# Altium schematic symbol library TI Power Management Shunt Voltage Reference.SchLib: 1526 symbols (part 6 of 18) (continued)
## LM4041CIDCKTG4
designator U?
Adjustable Precision Micropower Shunt Voltage Reference, 0.5% accuracy, 15 ppm / degC, 12 mA, -40 to 85 degC, 5-pin SC70 (DCK), Green (RoHS & no Sb/Br); Manufacturer: Texas Instruments; PartNumber: LM4041CIDCKTG4; Initial Accuracy @ 25/deg C(%): 0.5; Iout/Iz(Max)(mA): 12; Min Iz for Regulation(uA): 60; Rating: Catalog; Temp Coeff(Max)(ppm/ degree C): 100; Temp Coeff(Typ)(ppm/ degree C): 15; VO Adj(Min)(V): 1.225; DatasheetVersion: SLCS146E; PackageReference: DCK5; PackageDescription: 5-Pin Plastic Small-Outline Package, 2 x 1.3 mm Body, 0.65 mm Pitch, 2.1 mm Lead Span; Supplier 1: Digi-Key; Supplier Part Number 1: LM4041CIDCKTG4-ND; Supplier 2: Newark; Supplier Part Number 2: 41M3459; Supplier 3: Mouser; Supplier Part Number 3: 595-LM4041CIDCKTG4; Eco-Plan: Green (RoHS & no Sb/Br); SubFamily: Shunt Voltage Reference; VO Adj(Max)(V): 15; Mounting Technology: Surface Mount; Code_JEDEC: MO-203; ComponentLink1Description: Manufacturer URL; ComponentLink1URL: http://www.ti.com/; ComponentLink2Description: Datasheet; ComponentLink2URL: http://www.ti.com/general/docs/lit/getliterature.tsp?genericPartNumber=LM4041C&fileType=pdf; ComponentLink3Description: Package Specification; ComponentLink3URL: http://www.ti.com/litv/pdf/mpds025f
footprint TI-DCK5_N (SOT353, 5-Leads, Body 2x1.3mm, Pitch 0.65mm, Lead Span 2.1mm, IPC Medium Density)
part A pins: 2 ANODE, 3 CATHODE, 5 FB (in)
part B pins: 1 NC "No internal connection", 4 NC "No internal connection"

## LM4041CILP
designator U?
Adjustable Precision Micropower Shunt Voltage Reference, 0.5% accuracy, 15 ppm / degC, 12 mA, -40 to 85 degC, 3-pin TO-92 (LP), Pb-Free (RoHS); Manufacturer: Texas Instruments; PartNumber: LM4041CILP; Initial Accuracy @ 25/deg C(%): 0.5; Iout/Iz(Max)(mA): 12; Min Iz for Regulation(uA): 60; Rating: Catalog; Temp Coeff(Max)(ppm/ degree C): 100; Temp Coeff(Typ)(ppm/ degree C): 15; VO Adj(Max)(V): 10; VO Adj(Min)(V): 1.225; DatasheetVersion: SLCS146E; PackageVersion: 4040001-2/C; PackageReference: LP3; PackageDescription: Plastic Cylindrical Package, Formed Lead Option (TO-92); Supplier 1: Digi-Key; Supplier Part Number 1: LM4041CILP-ND; Supplier 2: Newark; Supplier Part Number 2: 50M8856; Supplier 3: Mouser; Supplier Part Number 3: 595-LM4041CILP; Eco-Plan: Pb-Free (RoHS); SubFamily: Shunt Voltage Reference; Mounting Technology: Through Hole; Code_JEDEC: TO-226; ComponentLink1Description: Manufacturer URL; ComponentLink1URL: http://www.ti.com/; ComponentLink2Description: Datasheet; ComponentLink2URL: http://www.ti.com/general/docs/lit/getliterature.tsp?genericPartNumber=LM4041C&fileType=pdf; ComponentLink3Description: Package Specification; ComponentLink3URL: http://www.ti.com/litv/pdf/msot002a
footprint TI-LP3 (TO, Flat Index; 3 In-Line, Formed Axial Leads; Body Dia. 4.8mm; Leads 0.56 x 0.41 mm (max))
pins: 1 FB (in), 2 CATHODE, 3 ANODE

## LM4041CILPE3
designator U?
Adjustable Precision Micropower Shunt Voltage Reference, 0.5% accuracy, 15 ppm / degC, 12 mA, -40 to 85 degC, 3-pin TO-92 (LP), Pb-Free (RoHS); Manufacturer: Texas Instruments; PartNumber: LM4041CILPE3; Initial Accuracy @ 25/deg C(%): 0.5; Iout/Iz(Max)(mA): 12; Min Iz for Regulation(uA): 60; Rating: Catalog; Temp Coeff(Max)(ppm/ degree C): 100; Temp Coeff(Typ)(ppm/ degree C): 15; VO Adj(Min)(V): 1.225; DatasheetVersion: SLCS146E; PackageVersion: 4040001-2/C; PackageReference: LP3; PackageDescription: Plastic Cylindrical Package, Formed Lead Option (TO-92); Supplier 1: Digi-Key; Supplier Part Number 1: LM4041CILPE3-ND; Supplier 2: Newark; Supplier Part Number 2: 65M1446; Supplier 3: Mouser; Supplier Part Number 3: 595-LM4041CILPE3; Eco-Plan: Pb-Free (RoHS); SubFamily: Shunt Voltage Reference; VO Adj(Max)(V): 15; Mounting Technology: Through Hole; Code_JEDEC: TO-226; ComponentLink1Description: Manufacturer URL; ComponentLink1URL: http://www.ti.com/; ComponentLink2Description: Datasheet; ComponentLink2URL: http://www.ti.com/general/docs/lit/getliterature.tsp?genericPartNumber=LM4041C&fileType=pdf; ComponentLink3Description: Package Specification; ComponentLink3URL: http://www.ti.com/litv/pdf/msot002a
footprint TI-LP3 (TO, Flat Index; 3 In-Line, Formed Axial Leads; Body Dia. 4.8mm; Leads 0.56 x 0.41 mm (max))
pins: 1 FB (in), 2 CATHODE, 3 ANODE

## LM4041CILPR
designator U?
Adjustable Precision Micropower Shunt Voltage Reference, 0.5% accuracy, 15 ppm / degC, 12 mA, -40 to 85 degC, 3-pin TO-92 (LP), Pb-Free (RoHS); Manufacturer: Texas Instruments; PartNumber: LM4041CILPR; Initial Accuracy @ 25/deg C(%): 0.5; Iout/Iz(Max)(mA): 12; Min Iz for Regulation(uA): 60; Rating: Catalog; Temp Coeff(Max)(ppm/ degree C): 100; Temp Coeff(Typ)(ppm/ degree C): 15; VO Adj(Max)(V): 10; VO Adj(Min)(V): 1.225; DatasheetVersion: SLCS146E; PackageVersion: 4040001-2/C; PackageReference: LP3; PackageDescription: Plastic Cylindrical Package, Formed Lead Option (TO-92); Supplier 1: Digi-Key; Supplier Part Number 1: 296-22173-3-ND; Supplier 2: Digi-Key; Supplier Part Number 2: 296-22173-1-ND; Supplier 3: Newark; Supplier Part Number 3: 50M8857; Supplier 4: Mouser; Supplier Part Number 4: 595-LM4041CILPR; Eco-Plan: Pb-Free (RoHS); SubFamily: Shunt Voltage Reference; Mounting Technology: Through Hole; Code_JEDEC: TO-226; ComponentLink1Description: Manufacturer URL; ComponentLink1URL: http://www.ti.com/; ComponentLink2Description: Datasheet; ComponentLink2URL: http://www.ti.com/general/docs/lit/getliterature.tsp?genericPartNumber=LM4041C&fileType=pdf; ComponentLink3Description: Package Specification; ComponentLink3URL: http://www.ti.com/litv/pdf/msot002a
footprint TI-LP3 (TO, Flat Index; 3 In-Line, Formed Axial Leads; Body Dia. 4.8mm; Leads 0.56 x 0.41 mm (max))
pins: 1 FB (in), 2 CATHODE, 3 ANODE

## LM4041CILPRE3
designator U?
Adjustable Precision Micropower Shunt Voltage Reference, 0.5% accuracy, 15 ppm / degC, 12 mA, -40 to 85 degC, 3-pin TO-92 (LP), Pb-Free (RoHS); Manufacturer: Texas Instruments; PartNumber: LM4041CILPRE3; Initial Accuracy @ 25/deg C(%): 0.5; Iout/Iz(Max)(mA): 12; Min Iz for Regulation(uA): 60; Rating: Catalog; Temp Coeff(Max)(ppm/ degree C): 100; Temp Coeff(Typ)(ppm/ degree C): 15; VO Adj(Min)(V): 1.225; DatasheetVersion: SLCS146E; PackageVersion: 4040001-2/C; PackageReference: LP3; PackageDescription: Plastic Cylindrical Package, Formed Lead Option (TO-92); Supplier 1: Digi-Key; Supplier Part Number 1: LM4041CILPRE3-ND; Supplier 2: Newark; Supplier Part Number 2: 65M1447; Supplier 3: Mouser; Supplier Part Number 3: 595-LM4041CILPRE3; Eco-Plan: Pb-Free (RoHS); SubFamily: Shunt Voltage Reference; VO Adj(Max)(V): 15; Mounting Technology: Through Hole; Code_JEDEC: TO-226; ComponentLink1Description: Manufacturer URL; ComponentLink1URL: http://www.ti.com/; ComponentLink2Description: Datasheet; ComponentLink2URL: http://www.ti.com/general/docs/lit/getliterature.tsp?genericPartNumber=LM4041C&fileType=pdf; ComponentLink3Description: Package Specification; ComponentLink3URL: http://www.ti.com/litv/pdf/msot002a
footprint TI-LP3 (TO, Flat Index; 3 In-Line, Formed Axial Leads; Body Dia. 4.8mm; Leads 0.56 x 0.41 mm (max))
pins: 1 FB (in), 2 CATHODE, 3 ANODE

## LM4041CQDBZR
designator U?
Adjustable Precision Micropower Shunt Voltage Reference, 0.5% accuracy, 15 ppm / degC, 12 mA, -40 to 125 degC, 3-pin SOT-23 (DBZ), Green (RoHS & no Sb/Br); Manufacturer: Texas Instruments; PartNumber: LM4041CQDBZR; Initial Accuracy @ 25/deg C(%): 0.5; Iout/Iz(Max)(mA): 12; Min Iz for Regulation(uA): 60; Rating: Catalog; Temp Coeff(Max)(ppm/ degree C): 100; Temp Coeff(Typ)(ppm/ degree C): 15; VO Adj(Max)(V): 10; VO Adj(Min)(V): 1.225; DatasheetVersion: SLCS146E; PackageVersion: 4203227/B; PackageReference: DBZ3; PackageDescription: 3-Pin Plastic Small Outline, Body 2.92 x 1.3 mm, Pitch 0.95 mm; Supplier 1: Digi-Key; Supplier Part Number 1: 296-17945-2-ND; Supplier 2: Digi-Key; Supplier Part Number 2: 296-17945-1-ND; Supplier 3: Digi-Key; Supplier Part Number 3: 296-17945-6-ND; Supplier 4: Mouser; Supplier Part Number 4: 595-LM4041CQDBZR; Eco-Plan: Green (RoHS & no Sb/Br); SubFamily: Shunt Voltage Reference; Mounting Technology: Surface Mount; Code_JEDEC: TO-236; ComponentLink1Description: Manufacturer URL; ComponentLink1URL: http://www.ti.com/; ComponentLink2Description: Datasheet; ComponentLink2URL: http://www.ti.com/general/docs/lit/getliterature.tsp?genericPartNumber=LM4041C&fileType=pdf; ComponentLink3Description: Package Specification; ComponentLink3URL: http://www.ti.com/litv/pdf/mpds108a
footprint TI-DBZ3_N (SOT23, 3-Leads, Body 2.92x1.3 mm, Pitch 0.95 mm, IPC Medium Density)
pins: 1 FB (in), 2 CATHODE, 3 ANODE

## LM4041CQDBZRG4
designator U?
Adjustable Precision Micropower Shunt Voltage Reference, 0.5% accuracy, 15 ppm / degC, 12 mA, -40 to 125 degC, 3-pin SOT-23 (DBZ), Green (RoHS & no Sb/Br); Manufacturer: Texas Instruments; PartNumber: LM4041CQDBZRG4; Initial Accuracy @ 25/deg C(%): 0.5; Iout/Iz(Max)(mA): 12; Min Iz for Regulation(uA): 60; Rating: Catalog; Temp Coeff(Max)(ppm/ degree C): 100; Temp Coeff(Typ)(ppm/ degree C): 15; VO Adj(Min)(V): 1.225; DatasheetVersion: SLCS146E; PackageVersion: 4203227/B; PackageReference: DBZ3; PackageDescription: 3-Pin Plastic Small Outline, Body 2.92 x 1.3 mm, Pitch 0.95 mm; Supplier 1: Digi-Key; Supplier Part Number 1: LM4041CQDBZRG4-ND; Supplier 2: Mouser; Supplier Part Number 2: 595-LM4041CQDBZRG4; Eco-Plan: Green (RoHS & no Sb/Br); SubFamily: Shunt Voltage Reference; VO Adj(Max)(V): 15; Mounting Technology: Surface Mount; Code_JEDEC: TO-236; ComponentLink1Description: Manufacturer URL; ComponentLink1URL: http://www.ti.com/; ComponentLink2Description: Datasheet; ComponentLink2URL: http://www.ti.com/general/docs/lit/getliterature.tsp?genericPartNumber=LM4041C&fileType=pdf; ComponentLink3Description: Package Specification; ComponentLink3URL: http://www.ti.com/litv/pdf/mpds108a
footprint TI-DBZ3_N (SOT23, 3-Leads, Body 2.92x1.3 mm, Pitch 0.95 mm, IPC Medium Density)
pins: 1 FB (in), 2 CATHODE, 3 ANODE

## LM4041CQDBZT
designator U?
Adjustable Precision Micropower Shunt Voltage Reference, 0.5% accuracy, 15 ppm / degC, 12 mA, -40 to 125 degC, 3-pin SOT-23 (DBZ), Green (RoHS & no Sb/Br); Manufacturer: Texas Instruments; PartNumber: LM4041CQDBZT; Initial Accuracy @ 25/deg C(%): 0.5; Iout/Iz(Max)(mA): 12; Min Iz for Regulation(uA): 60; Rating: Catalog; Temp Coeff(Max)(ppm/ degree C): 100; Temp Coeff(Typ)(ppm/ degree C): 15; VO Adj(Min)(V): 1.225; DatasheetVersion: SLCS146E; PackageVersion: 4203227/B; PackageReference: DBZ3; PackageDescription: 3-Pin Plastic Small Outline, Body 2.92 x 1.3 mm, Pitch 0.95 mm; Supplier 1: Digi-Key; Supplier Part Number 1: 296-32131-2-ND; Supplier 2: Digi-Key; Supplier Part Number 2: 296-32131-1-ND; Supplier 3: Digi-Key; Supplier Part Number 3: 296-32131-6-ND; Supplier 4: Newark; Supplier Part Number 4: 31K7144; Supplier 5: Mouser; Supplier Part Number 5: 595-LM4041CQDBZT; Eco-Plan: Green (RoHS & no Sb/Br); SubFamily: Shunt Voltage Reference; VO Adj(Max)(V): 15; Mounting Technology: Surface Mount; Code_JEDEC: TO-236; ComponentLink1Description: Manufacturer URL; ComponentLink1URL: http://www.ti.com/; ComponentLink2Description: Datasheet; ComponentLink2URL: http://www.ti.com/general/docs/lit/getliterature.tsp?genericPartNumber=LM4041C&fileType=pdf; ComponentLink3Description: Package Specification; ComponentLink3URL: http://www.ti.com/litv/pdf/mpds108a
footprint TI-DBZ3_N (SOT23, 3-Leads, Body 2.92x1.3 mm, Pitch 0.95 mm, IPC Medium Density)
pins: 1 FB (in), 2 CATHODE, 3 ANODE

## LM4041CQDBZTG4
designator U?
Adjustable Precision Micropower Shunt Voltage Reference, 0.5% accuracy, 15 ppm / degC, 12 mA, -40 to 125 degC, 3-pin SOT-23 (DBZ), Green (RoHS & no Sb/Br); Manufacturer: Texas Instruments; PartNumber: LM4041CQDBZTG4; Initial Accuracy @ 25/deg C(%): 0.5; Iout/Iz(Max)(mA): 12; Min Iz for Regulation(uA): 60; Rating: Catalog; Temp Coeff(Max)(ppm/ degree C): 100; Temp Coeff(Typ)(ppm/ degree C): 15; VO Adj(Min)(V): 1.225; DatasheetVersion: SLCS146E; PackageVersion: 4203227/B; PackageReference: DBZ3; PackageDescription: 3-Pin Plastic Small Outline, Body 2.92 x 1.3 mm, Pitch 0.95 mm; Supplier 1: Digi-Key; Supplier Part Number 1: LM4041CQDBZTG4-ND; Supplier 2: Farnell; Supplier Part Number 2: 1053792; Supplier 3: Newark; Supplier Part Number 3: 97K3502; Supplier 4: Mouser; Supplier Part Number 4: 595-LM4041CQDBZTG4; Eco-Plan: Green (RoHS & no Sb/Br); SubFamily: Shunt Voltage Reference; VO Adj(Max)(V): 15; Mounting Technology: Surface Mount; Code_JEDEC: TO-236; ComponentLink1Description: Manufacturer URL; ComponentLink1URL: http://www.ti.com/; ComponentLink2Description: Datasheet; ComponentLink2URL: http://www.ti.com/general/docs/lit/getliterature.tsp?genericPartNumber=LM4041C&fileType=pdf; ComponentLink3Description: Package Specification; ComponentLink3URL: http://www.ti.com/litv/pdf/mpds108a
footprint TI-DBZ3_N (SOT23, 3-Leads, Body 2.92x1.3 mm, Pitch 0.95 mm, IPC Medium Density)
pins: 1 FB (in), 2 CATHODE, 3 ANODE

## LM4041D12IDBZR
designator U?
Precision Micropower Shunt Voltage Reference, 1.0% accuracy, 1.225 V, 15 ppm / degC, 12 mA, -40 to 85 degC, 3-pin SOT-23 (DBZ), Green (RoHS & no Sb/Br); Manufacturer: Texas Instruments; PartNumber: LM4041D12IDBZR; Initial Accuracy @ 25/deg C(%): 1; Iout/Iz(Max)(mA): 12; Min Iz for Regulation(uA): 60; Rating: Catalog; Temp Coeff(Max)(ppm/ degree C): 150; Temp Coeff(Typ)(ppm/ degree C): 15; VO(V): 1.225; DatasheetVersion: SLCS146E; PackageVersion: 4203227/B; PackageReference: DBZ3; PackageDescription: 3-Pin Plastic Small Outline, Body 2.92 x 1.3 mm, Pitch 0.95 mm; Supplier 1: Digi-Key; Supplier Part Number 1: 296-20919-2-ND; Supplier 2: Digi-Key; Supplier Part Number 2: 296-20919-1-ND; Supplier 3: Digi-Key; Supplier Part Number 3: 296-20919-6-ND; Supplier 4: Newark; Supplier Part Number 4: 43K3377; Supplier 5: Mouser; Supplier Part Number 5: 595-LM4041D12IDBZR; Eco-Plan: Green (RoHS & no Sb/Br); SubFamily: Shunt Voltage Reference; Mounting Technology: Surface Mount; Code_JEDEC: TO-236; ComponentLink1Description: Manufacturer URL; ComponentLink1URL: http://www.ti.com/; ComponentLink2Description: Datasheet; ComponentLink2URL: http://www.ti.com/general/docs/lit/getliterature.tsp?genericPartNumber=LM4041D12&fileType=pdf; ComponentLink3Description: Package Specification; ComponentLink3URL: http://www.ti.com/litv/pdf/mpds108a
footprint TI-DBZ3_N (SOT23, 3-Leads, Body 2.92x1.3 mm, Pitch 0.95 mm, IPC Medium Density)
pins: 1 CATHODE, 2 ANODE, 3 NC

## LM4041D12IDBZRG4
designator U?
Precision Micropower Shunt Voltage Reference, 1.0% accuracy, 1.225 V, 15 ppm / degC, 12 mA, -40 to 85 degC, 3-pin SOT-23 (DBZ), Green (RoHS & no Sb/Br); Manufacturer: Texas Instruments; PartNumber: LM4041D12IDBZRG4; Initial Accuracy @ 25/deg C(%): 1; Iout/Iz(Max)(mA): 12; Min Iz for Regulation(uA): 60; Rating: Catalog; Temp Coeff(Max)(ppm/ degree C): 150; Temp Coeff(Typ)(ppm/ degree C): 15; VO(V): 1.225; DatasheetVersion: SLCS146E; PackageVersion: 4203227/B; PackageReference: DBZ3; PackageDescription: 3-Pin Plastic Small Outline, Body 2.92 x 1.3 mm, Pitch 0.95 mm; Supplier 1: Digi-Key; Supplier Part Number 1: LM4041D12IDBZRG4-ND; Supplier 2: Mouser; Supplier Part Number 2: 595-LM4041D12IDBZRG4; Eco-Plan: Green (RoHS & no Sb/Br); SubFamily: Shunt Voltage Reference; Mounting Technology: Surface Mount; Code_JEDEC: TO-236; ComponentLink1Description: Manufacturer URL; ComponentLink1URL: http://www.ti.com/; ComponentLink2Description: Datasheet; ComponentLink2URL: http://www.ti.com/general/docs/lit/getliterature.tsp?genericPartNumber=LM4041D12&fileType=pdf; ComponentLink3Description: Package Specification; ComponentLink3URL: http://www.ti.com/litv/pdf/mpds108a
footprint TI-DBZ3_N (SOT23, 3-Leads, Body 2.92x1.3 mm, Pitch 0.95 mm, IPC Medium Density)
pins: 1 CATHODE, 2 ANODE, 3 NC

## LM4041D12IDBZT
designator U?
Precision Micropower Shunt Voltage Reference, 1.0% accuracy, 1.225 V, 15 ppm / degC, 12 mA, -40 to 85 degC, 3-pin SOT-23 (DBZ), Green (RoHS & no Sb/Br); Manufacturer: Texas Instruments; PartNumber: LM4041D12IDBZT; Initial Accuracy @ 25/deg C(%): 1; Iout/Iz(Max)(mA): 12; Min Iz for Regulation(uA): 60; Rating: Catalog; Temp Coeff(Max)(ppm/ degree C): 150; Temp Coeff(Typ)(ppm/ degree C): 15; VO(V): 1.225; DatasheetVersion: SLCS146E; PackageVersion: 4203227/B; PackageReference: DBZ3; PackageDescription: 3-Pin Plastic Small Outline, Body 2.92 x 1.3 mm, Pitch 0.95 mm; Supplier 1: Digi-Key; Supplier Part Number 1: LM4041D12IDBZT-ND; Supplier 2: Newark; Supplier Part Number 2: 43K3378; Supplier 3: Mouser; Supplier Part Number 3: 595-LM4041D12IDBZT; Eco-Plan: Green (RoHS & no Sb/Br); SubFamily: Shunt Voltage Reference; Mounting Technology: Surface Mount; Code_JEDEC: TO-236; ComponentLink1Description: Manufacturer URL; ComponentLink1URL: http://www.ti.com/; ComponentLink2Description: Datasheet; ComponentLink2URL: http://www.ti.com/general/docs/lit/getliterature.tsp?genericPartNumber=LM4041D12&fileType=pdf; ComponentLink3Description: Package Specification; ComponentLink3URL: http://www.ti.com/litv/pdf/mpds108a
footprint TI-DBZ3_N (SOT23, 3-Leads, Body 2.92x1.3 mm, Pitch 0.95 mm, IPC Medium Density)
pins: 1 CATHODE, 2 ANODE, 3 NC

## LM4041D12IDBZTG4
designator U?
Precision Micropower Shunt Voltage Reference, 1.0% accuracy, 1.225 V, 15 ppm / degC, 12 mA, -40 to 85 degC, 3-pin SOT-23 (DBZ), Green (RoHS & no Sb/Br); Manufacturer: Texas Instruments; PartNumber: LM4041D12IDBZTG4; Initial Accuracy @ 25/deg C(%): 1; Iout/Iz(Max)(mA): 12; Min Iz for Regulation(uA): 60; Rating: Catalog; Temp Coeff(Max)(ppm/ degree C): 150; Temp Coeff(Typ)(ppm/ degree C): 15; VO(V): 1.225; DatasheetVersion: SLCS146E; PackageVersion: 4203227/B; PackageReference: DBZ3; PackageDescription: 3-Pin Plastic Small Outline, Body 2.92 x 1.3 mm, Pitch 0.95 mm; Supplier 1: Digi-Key; Supplier Part Number 1: LM4041D12IDBZTG4-ND; Supplier 2: Mouser; Supplier Part Number 2: 595-LM4041D12IDBZTG4; Eco-Plan: Green (RoHS & no Sb/Br); SubFamily: Shunt Voltage Reference; Mounting Technology: Surface Mount; Code_JEDEC: TO-236; ComponentLink1Description: Manufacturer URL; ComponentLink1URL: http://www.ti.com/; ComponentLink2Description: Datasheet; ComponentLink2URL: http://www.ti.com/general/docs/lit/getliterature.tsp?genericPartNumber=LM4041D12&fileType=pdf; ComponentLink3Description: Package Specification; ComponentLink3URL: http://www.ti.com/litv/pdf/mpds108a
footprint TI-DBZ3_N (SOT23, 3-Leads, Body 2.92x1.3 mm, Pitch 0.95 mm, IPC Medium Density)
pins: 1 CATHODE, 2 ANODE, 3 NC

## LM4041D12IDCKR
designator U?
Precision Micropower Shunt Voltage Reference, 1.0% accuracy, 1.225 V, 15 ppm / degC, 12 mA, -40 to 85 degC, 5-pin SC70 (DCK), Green (RoHS & no Sb/Br); Manufacturer: Texas Instruments; PartNumber: LM4041D12IDCKR; Initial Accuracy @ 25/deg C(%): 1; Iout/Iz(Max)(mA): 12; Min Iz for Regulation(uA): 60; Rating: Catalog; Temp Coeff(Max)(ppm/ degree C): 150; Temp Coeff(Typ)(ppm/ degree C): 15; VO(V): 1.225; DatasheetVersion: SLCS146E; PackageReference: DCK5; PackageDescription: 5-Pin Plastic Small-Outline Package, 2 x 1.3 mm Body, 0.65 mm Pitch, 2.1 mm Lead Span; Supplier 1: Digi-Key; Supplier Part Number 1: 296-20920-2-ND; Supplier 2: Digi-Key; Supplier Part Number 2: 296-20920-1-ND; Supplier 3: Digi-Key; Supplier Part Number 3: 296-20920-6-ND; Supplier 4: Newark; Supplier Part Number 4: 43K3379; Supplier 5: Mouser; Supplier Part Number 5: 595-LM4041D12IDCKR; Eco-Plan: Green (RoHS & no Sb/Br); SubFamily: Shunt Voltage Reference; Mounting Technology: Surface Mount; Code_JEDEC: MO-203; ComponentLink1Description: Manufacturer URL; ComponentLink1URL: http://www.ti.com/; ComponentLink2Description: Datasheet; ComponentLink2URL: http://www.ti.com/general/docs/lit/getliterature.tsp?genericPartNumber=LM4041D12&fileType=pdf; ComponentLink3Description: Package Specification; ComponentLink3URL: http://www.ti.com/litv/pdf/mpds025f
footprint TI-DCK5_N (SOT353, 5-Leads, Body 2x1.3mm, Pitch 0.65mm, Lead Span 2.1mm, IPC Medium Density)
part A pins: 1 ANODE, 3 CATHODE
part B pins: 2 NC, 4 NC, 5 NC

## LM4041D12IDCKRE4
designator U?
Precision Micropower Shunt Voltage Reference, 1.0% accuracy, 1.225 V, 15 ppm / degC, 12 mA, -40 to 85 degC, 5-pin SC70 (DCK), Green (RoHS & no Sb/Br); Manufacturer: Texas Instruments; PartNumber: LM4041D12IDCKRE4; Initial Accuracy @ 25/deg C(%): 1; Iout/Iz(Max)(mA): 12; Min Iz for Regulation(uA): 60; Rating: Catalog; Temp Coeff(Max)(ppm/ degree C): 150; Temp Coeff(Typ)(ppm/ degree C): 15; VO(V): 1.225; DatasheetVersion: SLCS146E; PackageReference: DCK5; PackageDescription: 5-Pin Plastic Small-Outline Package, 2 x 1.3 mm Body, 0.65 mm Pitch, 2.1 mm Lead Span; Supplier 1: Digi-Key; Supplier Part Number 1: LM4041D12IDCKRE4-ND; Supplier 2: Mouser; Supplier Part Number 2: 595-LM4041D12IDCKRE4; Eco-Plan: Green (RoHS & no Sb/Br); SubFamily: Shunt Voltage Reference; Mounting Technology: Surface Mount; Code_JEDEC: MO-203; ComponentLink1Description: Manufacturer URL; ComponentLink1URL: http://www.ti.com/; ComponentLink2Description: Datasheet; ComponentLink2URL: http://www.ti.com/general/docs/lit/getliterature.tsp?genericPartNumber=LM4041D12&fileType=pdf; ComponentLink3Description: Package Specification; ComponentLink3URL: http://www.ti.com/litv/pdf/mpds025f
footprint TI-DCK5_N (SOT353, 5-Leads, Body 2x1.3mm, Pitch 0.65mm, Lead Span 2.1mm, IPC Medium Density)
part A pins: 1 ANODE, 3 CATHODE
part B pins: 2 NC, 4 NC, 5 NC

## LM4041D12IDCKRG4
designator U?
Precision Micropower Shunt Voltage Reference, 1.0% accuracy, 1.225 V, 15 ppm / degC, 12 mA, -40 to 85 degC, 5-pin SC70 (DCK), Green (RoHS & no Sb/Br); Manufacturer: Texas Instruments; PartNumber: LM4041D12IDCKRG4; Initial Accuracy @ 25/deg C(%): 1; Iout/Iz(Max)(mA): 12; Min Iz for Regulation(uA): 60; Rating: Catalog; Temp Coeff(Max)(ppm/ degree C): 150; Temp Coeff(Typ)(ppm/ degree C): 15; VO(V): 1.225; DatasheetVersion: SLCS146E; PackageReference: DCK5; PackageDescription: 5-Pin Plastic Small-Outline Package, 2 x 1.3 mm Body, 0.65 mm Pitch, 2.1 mm Lead Span; Supplier 1: Digi-Key; Supplier Part Number 1: LM4041D12IDCKRG4-ND; Supplier 2: Mouser; Supplier Part Number 2: 595-LM4041D12IDCKRG4; Eco-Plan: Green (RoHS & no Sb/Br); SubFamily: Shunt Voltage Reference; Mounting Technology: Surface Mount; Code_JEDEC: MO-203; ComponentLink1Description: Manufacturer URL; ComponentLink1URL: http://www.ti.com/; ComponentLink2Description: Datasheet; ComponentLink2URL: http://www.ti.com/general/docs/lit/getliterature.tsp?genericPartNumber=LM4041D12&fileType=pdf; ComponentLink3Description: Package Specification; ComponentLink3URL: http://www.ti.com/litv/pdf/mpds025f
footprint TI-DCK5_N (SOT353, 5-Leads, Body 2x1.3mm, Pitch 0.65mm, Lead Span 2.1mm, IPC Medium Density)
part A pins: 1 ANODE, 3 CATHODE
part B pins: 2 NC, 4 NC, 5 NC

## LM4041D12ILP
designator U?
Precision Micropower Shunt Voltage Reference, 1.0% accuracy, 1.225 V, 15 ppm / degC, 12 mA, -40 to 85 degC, 3-pin TO-92 (LP), Pb-Free (RoHS); Manufacturer: Texas Instruments; PartNumber: LM4041D12ILP; Initial Accuracy @ 25/deg C(%): 1; Iout/Iz(Max)(mA): 12; Min Iz for Regulation(uA): 60; Rating: Catalog; Temp Coeff(Max)(ppm/ degree C): 150; Temp Coeff(Typ)(ppm/ degree C): 15; VO Adj(Max)(V): 10; VO Adj(Min)(V): 1.225; DatasheetVersion: SLCS146E; PackageVersion: 4040001-2/C; PackageReference: LP3; PackageDescription: Plastic Cylindrical Package, Formed Lead Option (TO-92); Supplier 1: Digi-Key; Supplier Part Number 1: 296-31374-ND; Supplier 2: Newark; Supplier Part Number 2: 18M2431; Supplier 3: Mouser; Supplier Part Number 3: 595-LM4041D12ILP; Eco-Plan: Pb-Free (RoHS); SubFamily: Shunt Voltage Reference; Mounting Technology: Through Hole; Code_JEDEC: TO-226; ComponentLink1Description: Manufacturer URL; ComponentLink1URL: http://www.ti.com/; ComponentLink2Description: Datasheet; ComponentLink2URL: http://www.ti.com/general/docs/lit/getliterature.tsp?genericPartNumber=LM4041D12&fileType=pdf; ComponentLink3Description: Package Specification; ComponentLink3URL: http://www.ti.com/litv/pdf/msot002a
footprint TI-LP3 (TO, Flat Index; 3 In-Line, Formed Axial Leads; Body Dia. 4.8mm; Leads 0.56 x 0.41 mm (max))
pins: 1 NC, 2 CATHODE, 3 ANODE

## LM4041D12ILPE3
designator U?
Precision Micropower Shunt Voltage Reference, 1.0% accuracy, 1.225 V, 15 ppm / degC, 12 mA, -40 to 85 degC, 3-pin TO-92 (LP), Pb-Free (RoHS); Manufacturer: Texas Instruments; PartNumber: LM4041D12ILPE3; Initial Accuracy @ 25/deg C(%): 1; Iout/Iz(Max)(mA): 12; Min Iz for Regulation(uA): 60; Rating: Catalog; Temp Coeff(Max)(ppm/ degree C): 150; Temp Coeff(Typ)(ppm/ degree C): 15; VO(V): 1.225; DatasheetVersion: SLCS146E; PackageVersion: 4040001-2/C; PackageReference: LP3; PackageDescription: Plastic Cylindrical Package, Formed Lead Option (TO-92); Supplier 1: Digi-Key; Supplier Part Number 1: LM4041D12ILPE3-ND; Supplier 2: Newark; Supplier Part Number 2: 65M1452; Supplier 3: Mouser; Supplier Part Number 3: 595-LM4041D12ILPE3; Eco-Plan: Pb-Free (RoHS); SubFamily: Shunt Voltage Reference; Mounting Technology: Through Hole; Code_JEDEC: TO-226; ComponentLink1Description: Manufacturer URL; ComponentLink1URL: http://www.ti.com/; ComponentLink2Description: Datasheet; ComponentLink2URL: http://www.ti.com/general/docs/lit/getliterature.tsp?genericPartNumber=LM4041D12&fileType=pdf; ComponentLink3Description: Package Specification; ComponentLink3URL: http://www.ti.com/litv/pdf/msot002a; ComponentLink4Description: URL Link1; ComponentLink4URL: Samples URL:http://www.ti.com/product/lm4041d12
footprint TI-LP3 (TO, Flat Index; 3 In-Line, Formed Axial Leads; Body Dia. 4.8mm; Leads 0.56 x 0.41 mm (max))
pins: 1 NC, 2 CATHODE, 3 ANODE

## LM4041D12ILPR
designator U?
Precision Micropower Shunt Voltage Reference, 1.0% accuracy, 1.2 V, 15 ppm / degC, 12 mA, -40 to 85 degC, 3-pin TO-92 (LP), Pb-Free (RoHS); Manufacturer: Texas Instruments; PartNumber: LM4041D12ILPR; Iout/Iz(Max)(mA): 12; Min Iz for Regulation(uA): 60; Rating: Catalog; Temp Coeff(Max)(ppm/ degree C): 150; Temp Coeff(Typ)(ppm/ degree C): 15; VO Adj(Max)(V): 10; VO Adj(Min)(V): 1.225; DatasheetVersion: SLCS146E; PackageVersion: 4040001-2/C; PackageReference: LP3; PackageDescription: Plastic Cylindrical Package, Formed Lead Option (TO-92); Supplier 1: Digi-Key; Supplier Part Number 1: 296-20748-2-ND; Supplier 2: Digi-Key; Supplier Part Number 2: 296-20748-1-ND; Supplier 3: Newark; Supplier Part Number 3: 18M2432; Supplier 4: Mouser; Supplier Part Number 4: 595-LM4041D12ILPR; Eco-Plan: Pb-Free (RoHS); SubFamily: Shunt Voltage Reference; VO(V): 1.225; Mounting Technology: Through Hole; Code_JEDEC: TO-226; ComponentLink1Description: Manufacturer URL; ComponentLink1URL: http://www.ti.com/; ComponentLink2Description: Datasheet; ComponentLink2URL: http://www.ti.com/general/docs/lit/getliterature.tsp?genericPartNumber=LM4041D12&fileType=pdf; ComponentLink3Description: Package Specification; ComponentLink3URL: http://www.ti.com/litv/pdf/msot002a
footprint TI-LP3 (TO, Flat Index; 3 In-Line, Formed Axial Leads; Body Dia. 4.8mm; Leads 0.56 x 0.41 mm (max))
pins: 1 NC, 2 CATHODE, 3 ANODE

## LM4041D12ILPRE3
designator U?
Precision Micropower Shunt Voltage Reference, 1.0% accuracy, 1.225 V, 15 ppm / degC, 12 mA, -40 to 85 degC, 3-pin TO-92 (LP), Pb-Free (RoHS); Manufacturer: Texas Instruments; PartNumber: LM4041D12ILPRE3; Iout/Iz(Max)(mA): 12; Min Iz for Regulation(uA): 60; Rating: Catalog; Temp Coeff(Max)(ppm/ degree C): 150; Temp Coeff(Typ)(ppm/ degree C): 15; VO Adj(Max)(V): 10; VO Adj(Min)(V): 1.225; DatasheetVersion: SLCS146E; PackageVersion: 4040001-2/C; PackageReference: LP3; PackageDescription: Plastic Cylindrical Package, Formed Lead Option (TO-92); Supplier 1: Digi-Key; Supplier Part Number 1: LM4041D12ILPRE3-ND; Supplier 2: Mouser; Supplier Part Number 2: 595-LM4041D12ILPRE3; Eco-Plan: Pb-Free (RoHS); SubFamily: Shunt Voltage Reference; VO(V): 1.225; Mounting Technology: Through Hole; Code_JEDEC: TO-226; ComponentLink1Description: Manufacturer URL; ComponentLink1URL: http://www.ti.com/; ComponentLink2Description: Datasheet; ComponentLink2URL: http://www.ti.com/general/docs/lit/getliterature.tsp?genericPartNumber=LM4041D12&fileType=pdf; ComponentLink3Description: Package Specification; ComponentLink3URL: http://www.ti.com/litv/pdf/msot002a
footprint TI-LP3 (TO, Flat Index; 3 In-Line, Formed Axial Leads; Body Dia. 4.8mm; Leads 0.56 x 0.41 mm (max))
pins: 1 NC, 2 CATHODE, 3 ANODE

## LM4041D12QDBZR
designator U?
Precision Micropower Shunt Voltage Reference, 1.0% accuracy, 1.225 V, 15 ppm / degC, 12 mA, -40 to 125 degC, 3-pin SOT-23 (DBZ), Green (RoHS & no Sb/Br); Manufacturer: Texas Instruments; PartNumber: LM4041D12QDBZR; Initial Accuracy @ 25/deg C(%): 1; Iout/Iz(Max)(mA): 12; Min Iz for Regulation(uA): 60; Rating: Catalog; Temp Coeff(Max)(ppm/ degree C): 150; Temp Coeff(Typ)(ppm/ degree C): 15; VO(V): 1.225; DatasheetVersion: SLCS146E; PackageVersion: 4203227/B; PackageReference: DBZ3; PackageDescription: 3-Pin Plastic Small Outline, Body 2.92 x 1.3 mm, Pitch 0.95 mm; Supplier 1: Digi-Key; Supplier Part Number 1: 296-20921-2-ND; Supplier 2: Digi-Key; Supplier Part Number 2: 296-20921-1-ND; Supplier 3: Digi-Key; Supplier Part Number 3: 296-20921-6-ND; Supplier 4: Farnell; Supplier Part Number 4: 1575130; Supplier 5: Newark; Supplier Part Number 5: 43K3380; Supplier 6: Mouser; Supplier Part Number 6: 595-LM4041D12QDBZR; Eco-Plan: Green (RoHS & no Sb/Br); SubFamily: Shunt Voltage Reference; Mounting Technology: Surface Mount; Code_JEDEC: TO-236; ComponentLink1Description: Manufacturer URL; ComponentLink1URL: http://www.ti.com/; ComponentLink2Description: Datasheet; ComponentLink2URL: http://www.ti.com/general/docs/lit/getliterature.tsp?genericPartNumber=LM4041D12&fileType=pdf; ComponentLink3Description: Package Specification; ComponentLink3URL: http://www.ti.com/litv/pdf/mpds108a
footprint TI-DBZ3_N (SOT23, 3-Leads, Body 2.92x1.3 mm, Pitch 0.95 mm, IPC Medium Density)
pins: 1 CATHODE, 2 ANODE, 3 NC

## LM4041D12QDBZRG4
designator U?
Precision Micropower Shunt Voltage Reference, 1.0% accuracy, 1.2 V, 15 ppm / degC, 12 mA, -40 to 125 degC, 3-pin SOT-23 (DBZ), Green (RoHS & no Sb/Br); Manufacturer: Texas Instruments; PartNumber: LM4041D12QDBZRG4; Initial Accuracy @ 25/deg C(%): 1; Iout/Iz(Max)(mA): 12; Min Iz for Regulation(uA): 60; Rating: Catalog; Temp Coeff(Max)(ppm/ degree C): 150; Temp Coeff(Typ)(ppm/ degree C): 15; VO(V): 1.2; DatasheetVersion: SLCS146E; PackageVersion: 4203227/B; PackageReference: DBZ3; PackageDescription: 3-Pin Plastic Small Outline, Body 2.92 x 1.3 mm, Pitch 0.95 mm; Supplier 1: Digi-Key; Supplier Part Number 1: LM4041D12QDBZRG4-ND; Supplier 2: Mouser; Supplier Part Number 2: 595-LM4041D12QDBZRG4; Eco-Plan: Green (RoHS & no Sb/Br); SubFamily: Shunt Voltage Reference; Mounting Technology: Surface Mount; Code_JEDEC: TO-236; ComponentLink1Description: Manufacturer URL; ComponentLink1URL: http://www.ti.com/; ComponentLink2Description: Datasheet; ComponentLink2URL: http://www.ti.com/general/docs/lit/getliterature.tsp?genericPartNumber=LM4041D12&fileType=pdf; ComponentLink3Description: Package Specification; ComponentLink3URL: http://www.ti.com/litv/pdf/mpds108a
footprint TI-DBZ3_N (SOT23, 3-Leads, Body 2.92x1.3 mm, Pitch 0.95 mm, IPC Medium Density)
pins: 1 CATHODE, 2 ANODE, 3 NC

## LM4041D12QDBZT
designator U?
Precision Micropower Shunt Voltage Reference, 1.0% accuracy, 1.2 V, 15 ppm / degC, 12 mA, -40 to 125 degC, 3-pin SOT-23 (DBZ), Green (RoHS & no Sb/Br); Manufacturer: Texas Instruments; PartNumber: LM4041D12QDBZT; Initial Accuracy @ 25/deg C(%): 1; Iout/Iz(Max)(mA): 12; Min Iz for Regulation(uA): 60; Rating: Catalog; Temp Coeff(Max)(ppm/ degree C): 150; Temp Coeff(Typ)(ppm/ degree C): 15; VO(V): 1.2; DatasheetVersion: SLCS146E; PackageVersion: 4203227/B; PackageReference: DBZ3; PackageDescription: 3-Pin Plastic Small Outline, Body 2.92 x 1.3 mm, Pitch 0.95 mm; Supplier 1: Digi-Key; Supplier Part Number 1: LM4041D12QDBZT-ND; Supplier 2: Newark; Supplier Part Number 2: 43K3381; Supplier 3: Mouser; Supplier Part Number 3: 595-LM4041D12QDBZT; Eco-Plan: Green (RoHS & no Sb/Br); SubFamily: Shunt Voltage Reference; Mounting Technology: Surface Mount; Code_JEDEC: TO-236; ComponentLink1Description: Manufacturer URL; ComponentLink1URL: http://www.ti.com/; ComponentLink2Description: Datasheet; ComponentLink2URL: http://www.ti.com/general/docs/lit/getliterature.tsp?genericPartNumber=LM4041D12&fileType=pdf; ComponentLink3Description: Package Specification; ComponentLink3URL: http://www.ti.com/litv/pdf/mpds108a
footprint TI-DBZ3_N (SOT23, 3-Leads, Body 2.92x1.3 mm, Pitch 0.95 mm, IPC Medium Density)
pins: 1 CATHODE, 2 ANODE, 3 NC

## LM4041D12QDBZTG4
designator U?
Precision Micropower Shunt Voltage Reference, 1.0% accuracy, 1.2 V, 15 ppm / degC, 12 mA, -40 to 125 degC, 3-pin SOT-23 (DBZ), Green (RoHS & no Sb/Br); Manufacturer: Texas Instruments; PartNumber: LM4041D12QDBZTG4; Initial Accuracy @ 25/deg C(%): 1; Iout/Iz(Max)(mA): 12; Min Iz for Regulation(uA): 60; Rating: Catalog; Temp Coeff(Max)(ppm/ degree C): 150; Temp Coeff(Typ)(ppm/ degree C): 15; VO(V): 1.2; DatasheetVersion: SLCS146E; PackageVersion: 4203227/B; PackageReference: DBZ3; PackageDescription: 3-Pin Plastic Small Outline, Body 2.92 x 1.3 mm, Pitch 0.95 mm; Supplier 1: Digi-Key; Supplier Part Number 1: LM4041D12QDBZTG4-ND; Supplier 2: Mouser; Supplier Part Number 2: 595-LM4041D12QDBZTG4; Eco-Plan: Green (RoHS & no Sb/Br); SubFamily: Shunt Voltage Reference; Mounting Technology: Surface Mount; Code_JEDEC: TO-236; ComponentLink1Description: Manufacturer URL; ComponentLink1URL: http://www.ti.com/; ComponentLink2Description: Datasheet; ComponentLink2URL: http://www.ti.com/general/docs/lit/getliterature.tsp?genericPartNumber=LM4041D12&fileType=pdf; ComponentLink3Description: Package Specification; ComponentLink3URL: http://www.ti.com/litv/pdf/mpds108a
footprint TI-DBZ3_N (SOT23, 3-Leads, Body 2.92x1.3 mm, Pitch 0.95 mm, IPC Medium Density)
pins: 1 CATHODE, 2 ANODE, 3 NC
